# Altium schematic symbol library Electronic Devices_LIB.SchLib: 703 symbols (part 2 of 8) (continued)
## DIO_SCTKY_30V_2A_SDM2U30CSP-7
designator D?, comment SDM2U30CSP-7
Rectifier Diode Schottky 30V 2A 2-Pin X3-WLP T/R; Manufacturer: Diodes; Capacitance: 1.1E-10F; Reverse Voltage (DC): 20V; Forward Voltage: 480mV; Max Forward Surge Current (Ifsm): 20A; Max Reverse Current: 150uA; Supplier 1: Digi-Key; Manufacturer Part Number: SDM2U30CSP-7; RoHS: Yes; Category: Rectifier Diodes; Stock 1: 100855; Pricing 1: 1=0.35, 10=0.285, 100=0.1939, 500=0.14544, 1000=0.10908, 2000=0.09999 (USD); Mount: Surface Mount; Number of Pins: 2; Min Operating Temperature: -55°C; Max Operating Temperature: 150°C; Packaging: Tape and Reel; Average Rectified Current: 2A; Forward Current: 2A; Max Repetitive Reverse Voltage (Vrrm): 20V; Package Quantity: 5000; Max Reverse Voltage (DC): 30V; Series: -; RoHS Compliant: Yes; ComponentLink1URL: http://www.mouser.com/ds/2/115/SDM2U30CSP-520285.pdf?src-supplier=Mouser; ComponentLink1Description: http://www.mouser.com/ds/2/115/SDM2U30CSP-520285.pdf?src-supplier=Mouser; ComponentLink2URL: https://www.diodes.com/assets/Datasheets/SDM2U30CSP.pdf?src-supplier=Digi-Key; ComponentLink2Description: https://www.diodes.com/assets/Datasheets/SDM2U30CSP.pdf?src-supplier=Digi-Key; Supplier Part Number 1: SDM2U30CSP-7DICT-ND
footprint DIO_SCKY_X3-WLB1608-2 (X3-WLB1608-2)
pins: 1 K, 2 A

## DIO_SCTKY_40V_2A
designator D?, comment SS24-E3/5BT
SS24 Series 40 V 2 A Surface Mount Schottky Barrier Rectifier - DO-214AA; Manufacturer: Vishay Semiconductors; Max Surge Current: 75A; Max Reverse Current: 400uA; Average Rectified Current: 2A; Element Configuration: Single; Max Reverse Voltage (DC): 40V; Forward Voltage: 500mV; Manufacturer Part Number: SS24-E3/5BT; RoHS: Yes; Category: Rectifier Diodes; Stock 1: 27700; Pricing 1: 1=0.46000, 10=0.39700, 100=0.29620, 500=0.23274, 1000=0.17984 (USD); Mount: Surface Mount; Case/Package: SMB; Number of Pins: 2; Contact Plating: Tin,Matte; Min Operating Temperature: -65°C; Max Operating Temperature: 125°C; Package Quantity: 3200; Packaging: Tape and Reel; Max Reverse Leakage Current: 400uA; Peak Non-Repetitive Surge Current: 75A; Max Forward Surge Current (Ifsm): 75A; Series: -; Length: 4.7mm; Width: 3.8mm; Radiation Hardening: No; Lead Free: Lead Free; RoHS Compliant: Yes; ComponentLink1URL: http://www.mouser.com/ds/2/427/ss22-59686.pdf?src-supplier=Mouser; ComponentLink1Description: http://www.mouser.com/ds/2/427/ss22-59686.pdf?src-supplier=Mouser; ComponentLink2URL: http://components.arrow.com/part/dataview/42820088S9351294N5680?src-supplier=Arrow+Electronics; ComponentLink2Description: http://components.arrow.com/part/dataview/42820088S9351294N5680?src-supplier=Arrow+Electronics; ComponentLink3URL: http://www.vishay.com/docs/89278/ss22.pdf?src-supplier=Digi-Key; ComponentLink3Description: http://www.vishay.com/docs/89278/ss22.pdf?src-supplier=Digi-Key; ComponentLink4URL: http://www.vishay.com/docs/88748/88748.pdf?src-supplier=Avnet; ComponentLink4Description: http://www.vishay.com/docs/88748/88748.pdf?src-supplier=Avnet; ComponentLink5URL: http://www.vishay.com/docs/88748/88748.pdf?src-supplier=Future+Electronics; ComponentLink5Description: http://www.vishay.com/docs/88748/88748.pdf?src-supplier=Future+Electronics; Supplier 1: Digi-Key; Supplier 2: Mouser; Supplier 3: Arrow Electronics; Supplier Part Number 1: SS24-E3/5BTGICT-ND; Supplier Part Number 2: 625-SS24-E3/5BT; Supplier Part Number 3: SS24-E3/5BT; Forward Current: 2A; Max Repetitive Reverse Voltage (Vrrm): 40V
footprint DIO_DIOM4336X24N (MoldeDiode, 2-Leads, Body 4.31x3.62mm, IPC Medium Density)
pins: 1 K, 2 A

## DIO_SCTKY_40V_3A
designator D?, comment SS34-E3/9AT
Rectifier Diode, schottky, 40V V(Rrm), do-214Ab / Smc; Manufacturer: Vishay Semiconductors; Max Surge Current: 100A; Element Configuration: Single; Max Reverse Leakage Current: 500uA; Average Rectified Current: 3A; Forward Voltage: 500mV; Supplier 1: TTI; Manufacturer Part Number: SS34-E3/9AT; RoHS: Yes; Category: Rectifier Diodes; Stock 1: 7000; Pricing 1: 3500=0.18200 (USD); Mount: Surface Mount; Case/Package: SMC; Number of Pins: 2; Min Operating Temperature: -55°C; Max Operating Temperature: 125°C; Package Quantity: 3500; Packaging: Tape and Reel; Peak Non-Repetitive Surge Current: 100A; Max Reverse Voltage (DC): 40V; Series: -; Radiation Hardening: No; RoHS Compliant: Yes; ComponentLink1URL: https://datasheet.ciiva.com/920/ss32-920172.pdf?src-supplier=Digi-Key; ComponentLink1Description: https://datasheet.ciiva.com/920/ss32-920172.pdf?src-supplier=Digi-Key; Supplier Part Number 1: SS34-E3/9AT; Max Reverse Current: 500uA; Max Repetitive Reverse Voltage (Vrrm): 40V; Forward Current: 3A
footprint DIO_Vishay_SMC_MFG (DO-214AB (SMA))
pins: 1 K, 2 A

## DIO_SCTKY_40V_300mA_CD0603-B0340R
designator D?, comment CD0603-B0340R
Rectifier Diode Small Signal Schottky 40V 0.3A Automotive 2-Pin Case 0603(1608Metric) T/R; Manufacturer: Bourns; Average Rectified Current: 300mA; Max Forward Surge Current (Ifsm): 2A; Max Reverse Current: 3uA; Capacitance: 35pF; Supplier 1: Digikey; Manufacturer Part Number: CD0603-B0340R; RoHS: Yes; Category: Rectifier Diodes; Stock 1: 208205; Pricing 1: 1=0.38, 10=0.266, 100=0.1343, 500=0.10958, 1000=0.0813 (USD); Mount: Surface Mount; Case/Package: 0603; Case Code (Imperial): 0603; Case Code (Metric): 1608; Min Operating Temperature: -40°C; Max Operating Temperature: 125°C; Packaging: Cut Tape; Max Reverse Voltage (DC): 40V; Series: -; Forward Current: 300mA; Max Repetitive Reverse Voltage (Vrrm): 40V; Reverse Voltage: 40V; Height: 800um; RoHS Compliant: Yes; ComponentLink1URL: http://www.farnell.com/datasheets/2372434.pdf?src-supplier=Farnell; ComponentLink1Description: http://www.farnell.com/datasheets/2372434.pdf?src-supplier=Farnell; ComponentLink2URL: https://www.bourns.com/docs/product-datasheets/cd0603-b.pdf?src-supplier=Digikey; ComponentLink2Description: https://www.bourns.com/docs/product-datasheets/cd0603-b.pdf?src-supplier=Digikey; ComponentLink3URL: http://www.farnell.com/datasheets/2372434.pdf?src-supplier=Newark; ComponentLink3Description: http://www.farnell.com/datasheets/2372434.pdf?src-supplier=Newark; Supplier Part Number 1: CD0603-B0340RDKR-ND
footprint DIO_CD0603-B0340R_BRN
pins: 1 K, 2 A

## DIO_SCTKY_40V_520mA_ZLLS400TA
designator D?, comment ZLLS400TA
DIODE SCHOTTKY 40V 520MA SOD323; Manufacturer: Diodes Zetex; Peak Non-Repetitive Surge Current: 12A; Max Reverse Current: 10uA; Forward Voltage: 800mV; Reverse Recovery Time: 3ns; Max Forward Surge Current (Ifsm): 2.5A; Power Dissipation: 330mW; Polarity: Standard; Capacitance: 15pF; Supplier 1: Digi-Key; Manufacturer Part Number: ZLLS400TA; RoHS: Yes; Category: Rectifier Diodes; Stock 1: 46017; Pricing 1: 1=0.42, 10=0.359, 100=0.2495, 500=0.19478, 1000=0.15832 (USD); Mount: Surface Mount; Number of Pins: 2; Weight: 0.000173oz; Min Operating Temperature: -55°C; Max Operating Temperature: 150°C; Forward Current: 520mA; Max Repetitive Reverse Voltage (Vrrm): 40V; Package Quantity: 3000; Packaging: Tape and Reel; Average Rectified Current: 520mA; Termination: SMD/SMT; Voltage Rating (DC): 40V; Current Rating: 520mA; Output Current: 520mA; Max Reverse Voltage (DC): 40V; Series: -; Length: 1.8mm; Width: 1.4mm; Height: 0.8mm; Radiation Hardening: No; Lead Free: Lead Free; RoHS Compliant: Yes; ComponentLink1URL: https://datasheet.ciiva.com/914/zlls400-914210.pdf?src-supplier=Digi-Key; ComponentLink1Description: https://datasheet.ciiva.com/914/zlls400-914210.pdf?src-supplier=Digi-Key; ComponentLink2URL: https://datasheet.ciiva.com/914/zlls400-914210.pdf?src-supplier=Avnet; ComponentLink2Description: https://datasheet.ciiva.com/914/zlls400-914210.pdf?src-supplier=Avnet; ComponentLink3URL: https://datasheet.ciiva.com/4715/zlls400-4715517.pdf?src-supplier=Mouser; ComponentLink3Description: https://datasheet.ciiva.com/4715/zlls400-4715517.pdf?src-supplier=Mouser; ComponentLink4URL: https://datasheet.ciiva.com/16379/zlls400-16379288.pdf?src-supplier=Future+Electronics; ComponentLink4Description: https://datasheet.ciiva.com/16379/zlls400-16379288.pdf?src-supplier=Future+Electronics; ComponentLink5URL: https://datasheet.ciiva.com/914/zlls400-914211.pdf?src-supplier=Digi-Key; ComponentLink5Description: https://datasheet.ciiva.com/914/zlls400-914211.pdf?src-supplier=Digi-Key; ComponentLink6URL: https://datasheet.ciiva.com/914/zlls400-914212.pdf?src-supplier=Digi-Key; ComponentLink6Description: https://datasheet.ciiva.com/914/zlls400-914212.pdf?src-supplier=Digi-Key; Supplier Part Number 1: ZLLS400TACT-ND
footprint DIO_SOD2512X113N (SOD-323)
pins: 1 K, 2 A

## DIO_SCTKY_100V_6A_PMEG100V060ELPDZ
designator D?, comment PMEG100V060ELPDZ
DIODESCHOTTKY100V6ACFP15; Manufacturer: Nexperia; Supplier 1: Digikey; Manufacturer Part Number: PMEG100V060ELPDZ; RoHS: Yes; Category: Schottky Diodes; Stock 1: 60422; Pricing 1: 1=0.58, 10=0.504, 100=0.3491, 500=0.29166 (USD); RoHS Compliant: Yes; ComponentLink1URL: http://www.farnell.com/datasheets/2341403.pdf?src-supplier=Farnell; ComponentLink1Description: http://www.farnell.com/datasheets/2341403.pdf?src-supplier=Farnell; ComponentLink2URL: https://datasheet.octopart.com/PMEG100V060ELPDZ-Nexperia-datasheet-87796136.pdf?src-supplier=Future+Electronics; ComponentLink2Description: https://datasheet.octopart.com/PMEG100V060ELPDZ-Nexperia-datasheet-87796136.pdf?src-supplier=Future+Electronics
footprint DIO_SCKTY_PMEG060V100EPDAZ (SOT1289)
pins: A, K

## DIO_SCTKY_200V_1A_DFLS1200Q-7
designator D?, comment DFLS1200Q-7
Rectifier Diode Schottky 200V 1A Automotive 2-Pin PowerDI 123 T/R; Manufacturer: Diodes; Forward Voltage: 850mV; Max Forward Surge Current (Ifsm): 40A; Max Reverse Current: 100uA; Supplier 1: Mouser; Manufacturer Part Number: DFLS1200Q-7; RoHS: Yes; Category: Rectifier Diodes; Stock 1: 5123; Pricing 1: 1=0.65, 10=0.556, 50=0.556, 100=0.398, 500=0.333, 1000=0.27, 3000=0.251, 6000=0.25, 10000=0.25 (USD); Mount: Surface Mount; Number of Pins: 123; Min Operating Temperature: -55°C; Max Operating Temperature: 150°C; Packaging: Tape and Reel; Average Rectified Current: 1A; Forward Current: 1A; Max Repetitive Reverse Voltage (Vrrm): 200V; Package Quantity: 3000; Max Reverse Voltage (DC): 200V; Series: Automotive, AEC-Q101; RoHS Compliant: Yes; ComponentLink1URL: http://www.mouser.com/ds/2/115/DFLS1200Q-335808.pdf?src-supplier=Mouser; ComponentLink1Description: http://www.mouser.com/ds/2/115/DFLS1200Q-335808.pdf?src-supplier=Mouser; ComponentLink2URL: http://www.farnell.com/datasheets/2814371.pdf?src-supplier=Farnell; ComponentLink2Description: http://www.farnell.com/datasheets/2814371.pdf?src-supplier=Farnell; ComponentLink3URL: https://www.diodes.com/assets/Datasheets/DFLS1200Q.pdf?src-supplier=Digi-Key; ComponentLink3Description: https://www.diodes.com/assets/Datasheets/DFLS1200Q.pdf?src-supplier=Digi-Key; ComponentLink4URL: http://www.farnell.com/datasheets/2814371.pdf?src-supplier=Element14; ComponentLink4Description: http://www.farnell.com/datasheets/2814371.pdf?src-supplier=Element14; ComponentLink5URL: http://www.farnell.com/datasheets/2814371.pdf?src-supplier=Newark; ComponentLink5Description: http://www.farnell.com/datasheets/2814371.pdf?src-supplier=Newark; ComponentLink6URL: http://diodes.com/datasheets/DFLS1200Q.pdf?src-supplier=Avnet; ComponentLink6Description: http://diodes.com/datasheets/DFLS1200Q.pdf?src-supplier=Avnet; Supplier Part Number 1: 621-DFLS1200Q7
footprint DIO_SCKY_DFLS1200Q7 (POWERDI 123)
pins: 1 K, 2 A

## DIO_TVS_3.3V_ESD7C3.3DT5G
designator D?, comment ESD7C3.3DT5G
Transient Voltage Suppressor and ESD Protection Diode, SOT-723, 3.3 V; Manufacturer: ON Semiconductor; Direction: Unidirectional; Reverse Standoff Voltage: 3.3V; Capacitance: 13pF; Number of Channels: 2; Breakdown Voltage: 5V; Power Line Protection: No; Leakage Current: 1uA; Test Current: 1mA; Peak Pulse Power: 240mW; ESD Protection: Yes; Diode Type: ZENER; Clamping Voltage-Max: 10V; Supplier 1: Digi-Key; Manufacturer Part Number: ESD7C3.3DT5G; RoHS: Yes; Category: ESD and Circuit Protection ICs; Stock 1: 43169; Pricing 1: 1=0.43, 10=0.303, 100=0.1529, 500=0.1355, 1000=0.10544, 2000=0.09437 (USD); Case/Package: SOT-723-3; Number of Pins: 3; Min Operating Temperature: -55°C; Max Operating Temperature: 150°C; Package Quantity: 1; Packaging: Tape and Reel; Series: Automotive, AEC-Q101; Operating Supply Voltage: 3.3V; Polarity: Unidirectional; Termination: SMD/SMT; Number of Unidirectional Channels: 2; Min Breakdown Voltage: 5V; Working Voltage: 3.3V; Max Breakdown Voltage: 5V; Number of Lines: 2; Max Reverse Leakage Current: 1uA; Max Power Dissipation: 240mW; Length: 1.2mm; Width: 0.85mm; Height: 0.55mm; Depth: 0.8mm; Radiation Hardening: No; RoHS Compliant: Yes; Reach SVHC Compliant: No; Lead Free: Lead Free; Halogen Free: Halogen Free; ComponentLink1URL: https://datasheet.ciiva.com/1219/1748973-1219271.pdf?src-supplier=Newark; ComponentLink1Description: https://datasheet.ciiva.com/1219/1748973-1219271.pdf?src-supplier=Newark; ComponentLink2URL: https://datasheet.ciiva.com/339/esd7c3-3d-d-339817.pdf?src-supplier=Digi-Key; ComponentLink2Description: https://datasheet.ciiva.com/339/esd7c3-3d-d-339817.pdf?src-supplier=Digi-Key; ComponentLink3URL: https://datasheet.ciiva.com/11195/esd7c3-3d-d-11195335.pdf?src-supplier=Avnet; ComponentLink3Description: https://datasheet.ciiva.com/11195/esd7c3-3d-d-11195335.pdf?src-supplier=Avnet; ComponentLink4URL: https://datasheet.ciiva.com/1268/esd7c3-3d-d-1268407.pdf?src-supplier=Element14; ComponentLink4Description: https://datasheet.ciiva.com/1268/esd7c3-3d-d-1268407.pdf?src-supplier=Element14; ComponentLink5URL: https://datasheet.ciiva.com/339/esd7c3-3d-d-339819.pdf?src-supplier=Digi-Key; ComponentLink5Description: https://datasheet.ciiva.com/339/esd7c3-3d-d-339819.pdf?src-supplier=Digi-Key; ComponentLink6URL: https://datasheet.ciiva.com/16348/esd7c3-3d-d-16348886.pdf?src-supplier=Future+Electronics; ComponentLink6Description: https://datasheet.ciiva.com/16348/esd7c3-3d-d-16348886.pdf?src-supplier=Future+Electronics; Supplier Part Number 1: ESD7C3.3DT5GOSCT-ND
footprint DIO_TVS_SOTFL40P120X55-3N (SOT-723)
pins: 1 CATHODE1, 2 CATHODE2, 3 ANODE

## DIO_TVS_4CH_4V_IP4292CZ10-TBR,115
designator D?, comment IP4292CZ10-TBR,115
IP4292CZ10 Series 4 Channel 4 V 0.55 pF ESD Protected TVS Diode - DFN2510A-10; Manufacturer: Nexperia; Supplier 1: Digikey; Manufacturer Part Number: IP4292CZ10-TBR,115; RoHS: Yes; Category: ESD and Circuit Protection ICs; Stock 1: 24808; Pricing 1: 1=0.51, 10=0.398, 100=0.2386, 500=0.22096, 1000=0.15025, 2000=0.13833 (USD); RoHS Compliant: Yes; ComponentLink1URL: https://assets.nexperia.com/documents/data-sheet/IP4292CZ10-TBR.pdf?src-supplier=Digikey; ComponentLink1Description: https://assets.nexperia.com/documents/data-sheet/IP4292CZ10-TBR.pdf?src-supplier=Digikey; Supplier Part Number 1: 1727-1219-1-ND
footprint DIO_TVS_SON50P100X250X50-10N (10-XFDFN)
pins: 1 CH1, 2 CH2, 3 GND1 (power), 4 CH3, 5 CH4, 6 NC1, 7 NC2, 8 GND2 (power), 9 NC3, 10 NC4

## DIO_TVS_5.5V_PRTR5V0U2F,115
designator D?, comment PRTR5V0U2F,115
TVS DIODE 5.5VWM SOT886; Manufacturer: Nexperia; Supplier 1: Digikey; Manufacturer Part Number: PRTR5V0U2F,115; RoHS: Yes; Category: ESD and Circuit Protection ICs; Stock 1: 243532; Pricing 1: 1=0.41, 10=0.348, 100=0.2416, 500=0.18862, 1000=0.15332, 2000=0.13706 (USD); RoHS Compliant: Yes; ComponentLink1URL: http://www.farnell.com/datasheets/1712879.pdf?src-supplier=Farnell; ComponentLink1Description: http://www.farnell.com/datasheets/1712879.pdf?src-supplier=Farnell; ComponentLink2URL: https://datasheet.octopart.com/PRTR5V0U2F%2C115-Nexperia-datasheet-8330238.pdf?src-supplier=Newark; ComponentLink2Description: https://datasheet.octopart.com/PRTR5V0U2F%2C115-Nexperia-datasheet-8330238.pdf?src-supplier=Newark; ComponentLink3URL: https://assets.nexperia.com/documents/data-sheet/PRTR5V0U2F_PRTR5V0U2K.pdf?src-supplier=Digikey; ComponentLink3Description: https://assets.nexperia.com/documents/data-sheet/PRTR5V0U2F_PRTR5V0U2K.pdf?src-supplier=Digikey; ComponentLink4URL: https://datasheet.octopart.com/PRTR5V0U2F%2C115-Nexperia-datasheet-137756209.pdf?src-supplier=LKR; ComponentLink4Description: https://datasheet.octopart.com/PRTR5V0U2F%2C115-Nexperia-datasheet-137756209.pdf?src-supplier=LKR; Supplier Part Number 1: 1727-4161-1-ND
footprint DIO_TVS_Nexperia_SOT886_MFG (6-XFDFN)
pins: 1 I/O1, 2 GND (power), 3 I/O2, 4 I/O2, 5 VCC (power), 6 I/O1

## DIO_TVS_5V_ESD5Z5.0T1G
designator D?, comment ESD5Z5.0T1G
ESD5Z Series 6.2 V 80 pF 5 Vrwm TVS and ESD Protection Diodes - SOD-523; Manufacturer: ON Semiconductor; Direction: Unidirectional; Operating Supply Voltage: 5V; Min Breakdown Voltage: 6.2V; Peak Pulse Power: 174W; Peak Pulse Current: 9.4A; Test Current: 1mA; Max Reverse Leakage Current: 50nA; Number of Elements: 1; Capacitance: 80pF; Clamping Voltage: 18.6V; Power Line Protection: No; ESD Protection: Yes; Max Power Dissipation: 240W; Diode Type: ZENER; Clamping Voltage-Max: 11.6V; Supplier 1: Digikey; Manufacturer Part Number: ESD5Z5.0T1G; RoHS: Yes; Category: ESD and Circuit Protection ICs; Stock 1: 292695; Pricing 1: 1=0.24, 10=0.162, 100=0.0791, 500=0.06598, 1000=0.04584, 3000=0.03973, 6000=0.03686, 9000=0.03056, 30000=0.03002, 75000=0.02697, 150000=0.02337 (USD); Case/Package: SOD-523-2; Number of Pins: 2; Min Operating Temperature: -55°C; Max Operating Temperature: 150°C; Packaging: Tape and Reel; Reverse Standoff Voltage: 5V; Breakdown Voltage: 6.2V; Working Voltage: 5V; Package Quantity: 1; Max Surge Current: 9.4A; Number of Channels: 1; Reverse Breakdown Voltage: 6.2V; Number of Unidirectional Channels: 1; Polarity: Unidirectional; Termination: SMD/SMT; Max Breakdown Voltage: 6.2V; Leakage Current: 50nA; Number of Lines: 1; Series: Automotive, AEC-Q101; Length: 1.2mm; Width: 0.9mm; Height: 0.7mm; Depth: 0.8mm; Radiation Hardening: No; Lead Free: Lead Free; Halogen Free: Halogen Free; RoHS Compliant: Yes; Reach SVHC Compliant: No; ComponentLink1URL: https://datasheet.ciiva.com/15143/getdatasheetpartid-147990-15143766.pdf?src-supplier=Verical; ComponentLink1Description: https://datasheet.ciiva.com/15143/getdatasheetpartid-147990-15143766.pdf?src-supplier=Verical; ComponentLink2URL: https://datasheet.ciiva.com/30479/0900766b8125092b-30479039.pdf?src-supplier=Rs; ComponentLink2Description: https://datasheet.ciiva.com/30479/0900766b8125092b-30479039.pdf?src-supplier=Rs; ComponentLink3URL: https://datasheet.ciiva.com/22637/esd5z2-5t1-d-22637184.pdf?src-supplier=Element14; ComponentLink3Description: https://datasheet.ciiva.com/22637/esd5z2-5t1-d-22637184.pdf?src-supplier=Element14; ComponentLink4URL: https://datasheet.ciiva.com/27748/1311839-27748800.pdf?src-supplier=Jameco; ComponentLink4Description: https://datasheet.ciiva.com/27748/1311839-27748800.pdf?src-supplier=Jameco; ComponentLink5URL: https://datasheet.ciiva.com/339/esd5z2-5t1-d-339748.pdf?src-supplier=Digikey; ComponentLink5Description: https://datasheet.ciiva.com/339/esd5z2-5t1-d-339748.pdf?src-supplier=Digikey; ComponentLink6URL: https://datasheet.ciiva.com/339/esd5z2-5t1-d-339749.pdf?src-supplier=Digikey; ComponentLink6Description: https://datasheet.ciiva.com/339/esd5z2-5t1-d-339749.pdf?src-supplier=Digikey; ComponentLink7URL: https://datasheet.ciiva.com/339/esd5z2-5t1-d-339750.pdf?src-supplier=Digikey; ComponentLink7Description: https://datasheet.ciiva.com/339/esd5z2-5t1-d-339750.pdf?src-supplier=Digikey; ComponentLink8URL: https://datasheet.ciiva.com/16385/esd5z2-5t1-d-16385093.pdf?src-supplier=Future+Electronics; ComponentLink8Description: https://datasheet.ciiva.com/16385/esd5z2-5t1-d-16385093.pdf?src-supplier=Future+Electronics; ComponentLink9URL: https://datasheet.ciiva.com/8084/esd5z2-5t1-d-8084057.pdf?src-supplier=Avnet; ComponentLink9Description: https://datasheet.ciiva.com/8084/esd5z2-5t1-d-8084057.pdf?src-supplier=Avnet; ComponentLink10URL: https://datasheet.ciiva.com/22637/1878252-22637182.pdf?src-supplier=Element14; ComponentLink10Description: https://datasheet.ciiva.com/22637/1878252-22637182.pdf?src-supplier=Element14; Supplier Part Number 1: ESD5Z5.0T1GOSCT-ND
footprint SOD523_SODFL1608X70N
pins: 1 K, 2 A

## DIO_TVS_BID_5V_PESD5V0S1BB,115
designator D?, comment PESD5V0S1BB,115
ESD Suppressor Diode TVS Bi-Dir 5V Automotive 2-Pin SOD-523 T/R / TVS DIODE 5VWM 14VC SOD523; Manufacturer: Nexperia; Breakdown Voltage: 5.5V; Supplier 1: Digikey; Manufacturer Part Number: PESD5V0S1BB,115; RoHS: Yes; Category: ESD and Circuit Protection ICs; Stock 1: 221713; Pricing 1: 1=0.35, 10=0.243, 100=0.1226, 500=0.10004, 1000=0.07422, 3000=0.06245, 6000=0.0597, 9000=0.05163, 30000=0.05067, 75000=0.04195, 150000=0.04131 (USD); Number of Pins: 2; Packaging: Tape and Reel; Operating Supply Voltage: 5V; RoHS Compliant: Yes; ComponentLink1URL: http://www.farnell.com/datasheets/461331.pdf?src-supplier=Farnell; ComponentLink1Description: http://www.farnell.com/datasheets/461331.pdf?src-supplier=Farnell; ComponentLink2URL: https://www.mouser.com/ds/2/302/PESD5V0S1BA_BB_BL-1150699.pdf?src-supplier=Mouser; ComponentLink2Description: https://www.mouser.com/ds/2/302/PESD5V0S1BA_BB_BL-1150699.pdf?src-supplier=Mouser; ComponentLink3URL: https://assets.nexperia.com/documents/data-sheet/PESD5V0S1BA_BB_BL.pdf?src-supplier=Digikey; ComponentLink3Description: https://assets.nexperia.com/documents/data-sheet/PESD5V0S1BA_BB_BL.pdf?src-supplier=Digikey; ComponentLink4URL: http://www.farnell.com/datasheets/461331.pdf?src-supplier=Newark; ComponentLink4Description: http://www.farnell.com/datasheets/461331.pdf?src-supplier=Newark; Supplier Part Number 1: 1727-3838-1-ND
footprint DIO_TVS_SODFL1608X65N
pins: 1 K1, 2 K2

## DIO_TVS_BID_USBLC6-2SC6
designator D?, comment USBLC6-2SC6
USBLC6 Series 2 Line 6 V Uni / Bi-Directional ESD Protection - SOT-23-6; Manufacturer: STMicroelectronics; Capacitance: 3.5pF; Leakage Current: 150nA; Direction: Unidirectional,Bidirectional; Operating Supply Voltage: 1.1V; Number of Channels: 2; Breakdown Voltage: 6V; Clamping Voltage: 17V; Reverse Standoff Voltage: 5.25V; Power Line Protection: Yes; Test Current: 1mA; Peak Pulse Current: 5A; Data Rate: 480Mbps; Number of Elements: 1; Working Voltage: 5V; Supplier 1: Digi-Key; Manufacturer Part Number: USBLC6-2SC6; RoHS: Yes; Category: TVS Diodes; Stock 1: 77032; Pricing 1: 1=0.61, 10=0.522, 100=0.3897, 500=0.3062, 1000=0.2366 (USD); Mount: Surface Mount; Case/Package: SOT-23; Number of Pins: 6; Min Operating Temperature: -40°C; Max Operating Temperature: 125°C; Packaging: Tape and Reel; Termination: SMD/SMT; Series: USB; Package Quantity: 3000; Polarity: Unidirectional,Bidirectional; Number of Bidirectional Channels: 2; Min Breakdown Voltage: 6V; ESD Protection: Yes; Max Reverse Leakage Current: 150nA; Reverse Breakdown Voltage: 6V; Max Breakdown Voltage: 6V; Clamping Voltage-Max: 17V; Length: 3.05mm; Width: 1.75mm; Height: 1.3mm; Depth: 1.75mm; Radiation Hardening: No; Reach SVHC Compliant: No; Lead Free: Lead Free; RoHS Compliant: Yes; ComponentLink1URL: https://datasheet.ciiva.com/1268/1690354-1268384.pdf?src-supplier=Element14; ComponentLink1Description: https://datasheet.ciiva.com/1268/1690354-1268384.pdf?src-supplier=Element14; ComponentLink2URL: https://datasheet.ciiva.com/4508/cd00050750-113117-4508433.pdf?src-supplier=Mouser; ComponentLink2Description: https://datasheet.ciiva.com/4508/cd00050750-113117-4508433.pdf?src-supplier=Mouser; ComponentLink3URL: https://datasheet.ciiva.com/15143/getdatasheetpartid-148465-15143789.pdf?src-supplier=Verical; ComponentLink3Description: https://datasheet.ciiva.com/15143/getdatasheetpartid-148465-15143789.pdf?src-supplier=Verical; ComponentLink4URL: https://datasheet.ciiva.com/16200/cd00050750-16200026.pdf?src-supplier=Future+Electronics; ComponentLink4Description: https://datasheet.ciiva.com/16200/cd00050750-16200026.pdf?src-supplier=Future+Electronics; ComponentLink5URL: https://datasheet.ciiva.com/41444/001184109-da-01-en-ic-esd-protecti-usblc6-2sc6-sot-23-6-stm-41444156.pdf?src-supplier=Conrad; ComponentLink5Description: https://datasheet.ciiva.com/41444/001184109-da-01-en-ic-esd-protecti-usblc6-2sc6-sot-23-6-stm-41444156.pdf?src-supplier=Conrad; Supplier Part Number 1: 497-5235-6-ND
footprint DIO_TVS_SOT95P280X145-6N (SOT-23-6)
pins: 1 I/O1, 2 GND, 3 I/O2, 4 I/O2, 5 VBUS, 6 I/O1

## DIO_TVS_USB_PRTR5V0U2X,215
designator D?, comment PRTR5V0U2X,215
PRTR5V0U2X - Ultra low capacitance double rail-to-rail ESD protection diode; Manufacturer: Nexperia; Supplier 1: Mouser; Manufacturer Part Number: PRTR5V0U2X,215; RoHS: Yes; Category: ESD and Circuit Protection ICs; Stock 1: 109301; Pricing 1: 1=0.45, 10=0.368, 50=0.367, 100=0.262, 500=0.21, 1000=0.171, 3000=0.135, 9000=0.129, 10000=0.129, 24000=0.127, 45000=0.125 (USD); RoHS Compliant: Yes; ComponentLink1URL: http://www.farnell.com/datasheets/109718.pdf?src-supplier=Farnell; ComponentLink1Description: http://www.farnell.com/datasheets/109718.pdf?src-supplier=Farnell; ComponentLink2URL: https://assets.nexperia.com/documents/data-sheet/PRTR5V0U2X.pdf?src-supplier=Digikey; ComponentLink2Description: https://assets.nexperia.com/documents/data-sheet/PRTR5V0U2X.pdf?src-supplier=Digikey; ComponentLink3URL: http://www.farnell.com/datasheets/109718.pdf?src-supplier=Newark; ComponentLink3Description: http://www.farnell.com/datasheets/109718.pdf?src-supplier=Newark; ComponentLink4URL: https://datasheet.octopart.com/PRTR5V0U2X%2C215-Nexperia-datasheet-5405949.pdf?src-supplier=Element14; ComponentLink4Description: https://datasheet.octopart.com/PRTR5V0U2X%2C215-Nexperia-datasheet-5405949.pdf?src-supplier=Element14; Supplier Part Number 1: 771-PRTR5V0U2X-T/R
footprint DIO_TVS_Nexperia_SOT143B_MFG (SOT143B)
pins: 1 GND (power), 2 I/O 1 (io), 3 I/O 2 (io), 4 VCC (power)

## DIO_ZENER_3.3V_300mW_BZX585-B3V3,115
designator D?, comment BZX585-B3V3,115
DIODE ZENER 3.3V 300MW SOD523; Manufacturer: Nexperia; Supplier 1: Mouser; Manufacturer Part Number: BZX585-B3V3,115; RoHS: Yes; Category: Zener Diodes; Stock 1: 47007; Pricing 1: 1=0.38, 10=0.258, 50=0.258, 100=0.105, 1000=0.073, 3000=0.054, 9000=0.048, 10000=0.048, 24000=0.044, 45000=0.042, 99000=0.037 (USD); RoHS Compliant: Yes; ComponentLink1URL: http://www.farnell.com/datasheets/2174102.pdf?src-supplier=Farnell; ComponentLink1Description: http://www.farnell.com/datasheets/2174102.pdf?src-supplier=Farnell; ComponentLink2URL: https://assets.nexperia.com/documents/data-sheet/BZX585_SERIES.pdf?src-supplier=Digikey; ComponentLink2Description: https://assets.nexperia.com/documents/data-sheet/BZX585_SERIES.pdf?src-supplier=Digikey; ComponentLink3URL: https://datasheet.octopart.com/BZX585-B3V3%2C115-Nexperia-datasheet-81456219.pdf?src-supplier=Future+Electronics; ComponentLink3Description: https://datasheet.octopart.com/BZX585-B3V3%2C115-Nexperia-datasheet-81456219.pdf?src-supplier=Future+Electronics; Supplier Part Number 1: 771-BZX585-B3V3115
footprint DIO_ZENER_BZX585B3V3115 (SC-79, SOD-523)
pins: 1 K, 2 A

## DIO_ZENER_6.4V_SMAJ5.0A-E3/5A
designator D?, comment SMAJ5.0A-E3/5A
SMAJ5.0A Series 6.4 V 43.5 A 400 W Transient Voltage Suppressor - SMA (DO-214AC); Manufacturer: Vishay Semiconductors; Operating Supply Voltage: 5V; Max Surge Current: 43.5A; Direction: Unidirectional; Reverse Breakdown Voltage: 6.4V; Number of Elements: 1; Clamping Voltage: 9.2V; Peak Pulse Power: 400W; Max Breakdown Voltage: 7.07V; Test Current: 10mA; Max Reverse Leakage Current: 800uA; Max Forward Surge Current (Ifsm): 40A; Power Line Protection: No; Diode Type: ZENER; Supplier 1: Digikey; Manufacturer Part Number: SMAJ5.0A-E3/5A; RoHS: Yes; Category: TVS Diodes; Stock 1: 12869; Pricing 1: 1=0.43, 10=0.302, 100=0.1523, 500=0.13498, 1000=0.10504, 2000=0.09401 (USD); Case/Package: SMA; Number of Pins: 2; Min Operating Temperature: -55°C; Max Operating Temperature: 150°C; Package Quantity: 7500; Packaging: Tape and Reel; Breakdown Voltage: 6.4V; Number of Channels: 1; Polarity: Unidirectional; Reverse Standoff Voltage: 5V; Min Breakdown Voltage: 6.4V; Peak Pulse Current: 43.5A; Max Power Dissipation: 400W; Leakage Current: 800uA; Series: TransZorb®; Number of Unidirectional Channels: 1; Length: 4.5mm; Width: 2.79mm; Height: 2.09mm; Reach SVHC Compliant: Unknown; ComponentLink1URL: https://datasheet.ciiva.com/29588/smaj50a-29588012.pdf?src-supplier=Digikey; ComponentLink1Description: https://datasheet.ciiva.com/29588/smaj50a-29588012.pdf?src-supplier=Digikey; ComponentLink2URL: https://datasheet.ciiva.com/29588/smaj50a-29588013.pdf?src-supplier=Digikey; ComponentLink2Description: https://datasheet.ciiva.com/29588/smaj50a-29588013.pdf?src-supplier=Digikey; ComponentLink3URL: https://datasheet.ciiva.com/29588/smaj50a-29588014.pdf?src-supplier=Digikey; ComponentLink3Description: https://datasheet.ciiva.com/29588/smaj50a-29588014.pdf?src-supplier=Digikey; ComponentLink4URL: https://datasheet.ciiva.com/7659/548547-7659949.pdf?src-supplier=Element14; ComponentLink4Description: https://datasheet.ciiva.com/7659/548547-7659949.pdf?src-supplier=Element14; ComponentLink5URL: https://datasheet.ciiva.com/4510/smaj50a-241759-4510277.pdf?src-supplier=Mouser; ComponentLink5Description: https://datasheet.ciiva.com/4510/smaj50a-241759-4510277.pdf?src-supplier=Mouser; Supplier Part Number 1: SMAJ5.0A-E3/5AGIDKR-ND
footprint DIO_DIOM5127X229N (DO-214AC, SMA)
pins: 1 K, 2 A

## ESD_EMI_PCMF1USB3SZ
designator U?, comment PCMF1USB3SZ
PCMFxUSB3S - Common-mode EMI filter for differential channels with integrated ESD protection; Manufacturer: Nexperia; Supplier 1: Digikey; Manufacturer Part Number: PCMF1USB3SZ; RoHS: Yes; Category: Common Mode Chokes; Stock 1: 25964; Pricing 1: 1=0.5, 10=0.387, 100=0.2321, 500=0.21488, 1000=0.14612, 2000=0.13452 (USD); RoHS Compliant: Yes; ComponentLink1URL: http://www.farnell.com/datasheets/2043701.pdf?src-supplier=Farnell; ComponentLink1Description: http://www.farnell.com/datasheets/2043701.pdf?src-supplier=Farnell; ComponentLink2URL: https://assets.nexperia.com/documents/data-sheet/PCMFXUSB3S_SER.pdf?src-supplier=Digikey; ComponentLink2Description: https://assets.nexperia.com/documents/data-sheet/PCMFXUSB3S_SER.pdf?src-supplier=Digikey; ComponentLink3URL: http://www.farnell.com/datasheets/2043701.pdf?src-supplier=Newark; ComponentLink3Description: http://www.farnell.com/datasheets/2043701.pdf?src-supplier=Newark; ComponentLink4URL: http://www.farnell.com/datasheets/2043701.pdf?src-supplier=Element14; ComponentLink4Description: http://www.farnell.com/datasheets/2043701.pdf?src-supplier=Element14; ComponentLink5URL: https://datasheet.octopart.com/PCMF1USB3SZ-Nexperia-datasheet-137234894.pdf?src-supplier=TME; ComponentLink5Description: https://datasheet.octopart.com/PCMF1USB3SZ-Nexperia-datasheet-137234894.pdf?src-supplier=TME; Supplier Part Number 1: 1727-2508-1-ND
footprint ESD_PESD1USB3BCX
pins: A1 channel_1+_external, A2 channel_1-_external, B1 ground_channel_1, C1 channel_1+_internal, C2 channel_1-_internal

## ESD_EMI_PCMF2USB3SZ
designator U?, comment PCMF2USB3SZ
PCMFxUSB3S - Common-mode EMI filter for differential channels with integrated ESD protection; Manufacturer: Nexperia; Supplier 1: Digikey; Manufacturer Part Number: PCMF2USB3SZ; RoHS: Yes; Category: Common Mode Chokes; Stock 1: 45981; Pricing 1: 1=0.72, 10=0.62, 100=0.4295, 500=0.35888, 1000=0.30542, 2000=0.27202 (USD); RoHS Compliant: Yes; ComponentLink1URL: http://www.farnell.com/datasheets/2043701.pdf?src-supplier=Farnell; ComponentLink1Description: http://www.farnell.com/datasheets/2043701.pdf?src-supplier=Farnell; ComponentLink2URL: http://datasheet.octopart.com/PCMF2USB3SZ-Nexperia-datasheet-97399282.pdf?src-supplier=Rs; ComponentLink2Description: http://datasheet.octopart.com/PCMF2USB3SZ-Nexperia-datasheet-97399282.pdf?src-supplier=Rs; ComponentLink3URL: http://datasheet.octopart.com/PCMF2USB3SZ-Nexperia-datasheet-97399282.pdf?src-supplier=Mouser; ComponentLink3Description: http://datasheet.octopart.com/PCMF2USB3SZ-Nexperia-datasheet-97399282.pdf?src-supplier=Mouser; ComponentLink4URL: http://datasheet.octopart.com/PCMF2USB3SZ-Nexperia-datasheet-97399282.pdf?src-supplier=Avnet; ComponentLink4Description: http://datasheet.octopart.com/PCMF2USB3SZ-Nexperia-datasheet-97399282.pdf?src-supplier=Avnet; ComponentLink5URL: https://datasheet.octopart.com/PCMF2USB3SZ-Nexperia-datasheet-62320956.pdf?src-supplier=Newark; ComponentLink5Description: https://datasheet.octopart.com/PCMF2USB3SZ-Nexperia-datasheet-62320956.pdf?src-supplier=Newark; ComponentLink6URL: https://assets.nexperia.com/documents/data-sheet/PCMFXUSB3S_SER.pdf?src-supplier=Digikey; ComponentLink6Description: https://assets.nexperia.com/documents/data-sheet/PCMFXUSB3S_SER.pdf?src-supplier=Digikey; ComponentLink7URL: http://datasheet.octopart.com/PCMF2USB3SZ-Nexperia-datasheet-97399282.pdf?src-supplier=Digikey; ComponentLink7Description: http://datasheet.octopart.com/PCMF2USB3SZ-Nexperia-datasheet-97399282.pdf?src-supplier=Digikey; ComponentLink8URL: http://datasheet.octopart.com/PCMF2USB3SZ-Nexperia-datasheet-97399282.pdf?src-supplier=Future+Electronics; ComponentLink8Description: http://datasheet.octopart.com/PCMF2USB3SZ-Nexperia-datasheet-97399282.pdf?src-supplier=Future+Electronics; ComponentLink9URL: http://datasheet.octopart.com/PCMF2USB3SZ-Nexperia-datasheet-97399282.pdf?src-supplier=Verical; ComponentLink9Description: http://datasheet.octopart.com/PCMF2USB3SZ-Nexperia-datasheet-97399282.pdf?src-supplier=Verical; ComponentLink10URL: https://datasheet.octopart.com/PCMF2USB3SZ-Nexperia-datasheet-97399282.pdf?src-supplier=LKR; ComponentLink10Description: https://datasheet.octopart.com/PCMF2USB3SZ-Nexperia-datasheet-97399282.pdf?src-supplier=LKR; ComponentLink11URL: https://datasheet.octopart.com/PCMF2USB3SZ-Nexperia-datasheet-137234894.pdf?src-supplier=TME; ComponentLink11Description: https://datasheet.octopart.com/PCMF2USB3SZ-Nexperia-datasheet-137234894.pdf?src-supplier=TME; Supplier Part Number 1: 1727-2509-1-ND
footprint ESD_PCMF2USB3SZ
pins: A1 CH1_IN+, A2 CH1_IN-, A3 CH2_IN+, A4 CH2_IN-, B1 GND_CH1, B2 GND_CH2, C1 CH1_OUT+, C2 CH1_OUT-, C3 CH2_OUT+, C4 CH2_OUT-

## FILTER_COMMON_MODE_10mH_SU9HF-02100
designator F?, comment SU9HF-02100
Ind Common Mode Choke 10mH 0.2A 4 Ohm Bobbin Core 4-Pin Radial Tray; Manufacturer: KEMET; Number of Lines: 2; Max Current Rating: 200mA; Voltage Rating (AC): 250V; Supplier 1: Digikey; Manufacturer Part Number: SU9HF-02100; RoHS: Yes; Category: Common Mode Chokes; Stock 1: 842; Pricing 1: 1=0.83, 10=0.703, 25=0.6392, 40=0.60075, 100=0.4984, 300=0.46007, 500=0.45 (USD); Mount: Through Hole; Min Operating Temperature: -25°C; Max Operating Temperature: 120°C; Series: SU; RoHS Compliant: Yes; ComponentLink1URL: https://api.kemet.com/component-edge/download/datasheet/SU9HF-02100.pdf?src-supplier=Digikey; ComponentLink1Description: https://api.kemet.com/component-edge/download/datasheet/SU9HF-02100.pdf?src-supplier=Digikey; ComponentLink2URL: https://datasheet.octopart.com/SU9HF-02100-KEMET-datasheet-166228759.pdf?src-supplier=Element14; ComponentLink2Description: https://datasheet.octopart.com/SU9HF-02100-KEMET-datasheet-166228759.pdf?src-supplier=Element14; Supplier Part Number 1: 399-SU9HF-02100-ND
footprint FILTER_SU9HF02100
pins: 1, 2, 3, 4

## FUSEHOLDER_10A_500V_00318201
designator FH?, comment 00318201
Fuse Holder Open Design; 5 x 20mm; 500V; 10A; 1P; Solder THT 22.5mm; Manufacturer: Schurter; Body Material: Thermoplastic; Voltage Rating: 250V; Number of Poles: 1; Fuse Size: 5 x 20mm; Supplier 1: Digikey; Manufacturer Part Number: 00318201; RoHS: Yes; Category: Fuse Holders; Stock 1: 157144; Pricing 1: 1=0.91, 50=0.676, 100=0.608, 500=0.47 (USD); Color: Black; Material: Tin; Contact Plating: Tin; Contact Material: Copper Alloy,Tin; Min Operating Temperature: -40°C; Max Operating Temperature: 85°C; Packaging: Bulk; Current Rating: 10A; Voltage Rating (DC): 500V; Voltage Rating (AC): 500V; Termination: PC Pin; Fuse Current: 10A; Series: OGN; Length: 25mm; Depth: 10.8mm; Lead Free: Lead Free; Reach SVHC Compliant: No; ComponentLink1URL: https://datasheet.ciiva.com/16203/typ-ogn-16203626.pdf?src-supplier=Future+Electronics; ComponentLink1Description: https://datasheet.ciiva.com/16203/typ-ogn-16203626.pdf?src-supplier=Future+Electronics; ComponentLink2URL: https://datasheet.ciiva.com/15188/getdatasheetpartid-392104-15188042.pdf?src-supplier=Verical; ComponentLink2Description: https://datasheet.ciiva.com/15188/getdatasheetpartid-392104-15188042.pdf?src-supplier=Verical; ComponentLink3URL: https://datasheet.ciiva.com/1269/1842496-1269251.pdf?src-supplier=Element14; ComponentLink3Description: https://datasheet.ciiva.com/1269/1842496-1269251.pdf?src-supplier=Element14; Supplier Part Number 1: 486-1258-ND
footprint Schurter_0031.8201_MFG
pins: 1, 2

## IC_ADC_12BIT_ADS7924IRTER
designator U?, comment ADS7924IRTER
Quad Channel Single ADC SAR 100ksps 12-bit Serial 16-Pin WQFN EP T/R; Manufacturer: Texas Instruments; Operating Supply Voltage: 5V; Min Supply Voltage: 2.2V; Max Supply Voltage: 5.5V; Interface: I2C; Number of Bits: 12; Sampling Rate: 100000S/s; Resolution: 12b; Number of A/D Converters: 1; Number of Analog Inputs: 4; Polarity: Unipolar; Supply Type: Analog,Digital; Integral Nonlinearity (INL): 1.5LSB; Min Supply Voltage (DC): 1.65V; Nominal Supply Current: 5uA; Supplier 1: Digikey; Manufacturer Part Number: ADS7924IRTER; RoHS: Yes; Category: Analog to Digital Converters (ADCs); Stock 1: 7027; Pricing 1: 1=2.87, 10=2.141, 25=1.9596, 100=1.7605, 250=1.66544, 500=1.60818, 1000=1.56105, 3000=1.50283, 6000=1.47434 (USD); Case/Package: QFN; Number of Pins: 16; Contact Plating: Gold; Min Operating Temperature: -40°C; Max Operating Temperature: 85°C; Packaging: Tape and Reel; Package Quantity: 3000; Number of Inputs: 4; Max Supply Voltage (DC): 5.5V; Series: microPOWER™; Length: 3mm; Height: 800um; Thickness: 750um; Lead Free: Lead Free; RoHS Compliant: Yes; ComponentLink1URL: https://datasheet.ciiva.com/1261/ads7924-1261034.pdf?src-supplier=Digikey; ComponentLink1Description: https://datasheet.ciiva.com/1261/ads7924-1261034.pdf?src-supplier=Digikey; ComponentLink2URL: https://datasheet.ciiva.com/1261/ads7924-1261035.pdf?src-supplier=Digikey; ComponentLink2Description: https://datasheet.ciiva.com/1261/ads7924-1261035.pdf?src-supplier=Digikey; ComponentLink3URL: https://datasheet.ciiva.com/1261/ads7924-1261036.pdf?src-supplier=Digikey; ComponentLink3Description: https://datasheet.ciiva.com/1261/ads7924-1261036.pdf?src-supplier=Digikey; Supplier Part Number 1: 296-27456-1-ND
footprint IC_ADC_QFN50P300X300X80-17N-D
pins: 1 ~{RESET}, 2 ~{INT}, 3 SCLK, 4 SDA, 5 A0, 6 DGND, 7 PWRCON, 8 AGND, 9 CH3, 10 CH2, 11 CH1, 12 CH0, 13 MUXOUT, 14 ADCIN, 15 AVDD, 16 DVDD, 17 EP

## IC_ADC_16BITS_LTC2451CDDB#TRMPBF
designator U?, comment LTC2451CDDB#TRMPBF
1-Channel Single ADC Delta-Sigma 60sps 16-bit Serial 8-Pin DFN EP T/R; Manufacturer: Analog Devices / Linear Technology; Interface: I2C,Serial; Max Supply Voltage: 5.5V; Min Supply Voltage: 2.7V; Number of Bits: 16; Sampling Rate: 60S/s; Number of Inputs: 1; Resolution: 16b; Nominal Supply Current: 400uA; Supplier 1: Digikey; Manufacturer Part Number: LTC2451CDDB#TRMPBF; RoHS: Yes; Category: Analog to Digital Converters (ADCs); Stock 1: 15780; Pricing 1: 1=3.77, 10=3.389, 25=3.2044, 100=2.777, 250=2.6346 (USD); Case/Package: DFN; Number of Pins: 8; Min Operating Temperature: 0°C; Max Operating Temperature: 70°C; Package Quantity: 500; Packaging: Cut Tape; Number of A/D Converters: 1; Reach SVHC Compliant: No; RoHS Compliant: Yes; ComponentLink1URL: https://datasheet.ciiva.com/6665/25830-6665339.pdf?src-supplier=Digikey; ComponentLink1Description: https://datasheet.ciiva.com/6665/25830-6665339.pdf?src-supplier=Digikey; ComponentLink2URL: https://datasheet.ciiva.com/6665/25830-6665341.pdf?src-supplier=Digikey; ComponentLink2Description: https://datasheet.ciiva.com/6665/25830-6665341.pdf?src-supplier=Digikey; ComponentLink3URL: https://datasheet.ciiva.com/6665/25830-6665385.pdf?src-supplier=Digikey; ComponentLink3Description: https://datasheet.ciiva.com/6665/25830-6665385.pdf?src-supplier=Digikey; ComponentLink4URL: https://datasheet.ciiva.com/5784/1441932-5784410.pdf?src-supplier=Farnell; ComponentLink4Description: https://datasheet.ciiva.com/5784/1441932-5784410.pdf?src-supplier=Farnell; ComponentLink5URL: https://datasheet.ciiva.com/5784/1441932-5784411.pdf?src-supplier=Farnell; ComponentLink5Description: https://datasheet.ciiva.com/5784/1441932-5784411.pdf?src-supplier=Farnell; ComponentLink6URL: https://datasheet.ciiva.com/8035/1441932-8035406.pdf?src-supplier=Element14; ComponentLink6Description: https://datasheet.ciiva.com/8035/1441932-8035406.pdf?src-supplier=Element14; Supplier Part Number 1: LTC2451CDDB#TRMPBFCT-ND
footprint IC_ADC_SON50P200X300X80-9N-D (TSOT-23)
pins: 1 GND_1, 2 REF-, 3 REF+, 4 VCC, 5 GND_2, 6 IN, 7 SCL, 8 SDA, 9 EP

## IC_ADC_24BITS_4CH_PCM1865DBTR
designator U?, comment PCM1865DBTR
110dB 4-Channel Software-Controlled Audio ADC With Universal Front End 30-TSSOP -40 to 125; Manufacturer: Texas Instruments; Interface: I2C,SPI,Serial; Operating Supply Voltage: 3.3V; Sampling Rate: 192KS/s; Resolution: 24b; Operating Supply Current: 31mA; Supply Type: Single; Power Consumption: 145mW; Number of ADC Channels: 4; Number of Analog Inputs: 8; Number of DAC Channels: 0; Supplier 1: Digikey; Manufacturer Part Number: PCM1865DBTR; RoHS: Yes; Category: Amplifiers - Audio; Stock 1: 1985; Pricing 1: 1=6.29, 10=4.833, 25=4.468, 100=4.0667, 250=3.87544, 500=3.76014, 1000=3.66527, 2000=3.57534 (USD); Mount: Surface Mount; Case/Package: TSSOP; Number of Pins: 30; Weight: 0.003439oz; Min Operating Temperature: -40°C; Max Operating Temperature: 125°C; Package Quantity: 2000; Packaging: Tape and Reel; Series: -; Lead Free: Lead Free; RoHS Compliant: Yes; ComponentLink1URL: https://datasheet.ciiva.com/29699/pcm1861-29699238.pdf?src-supplier=Digikey; ComponentLink1Description: https://datasheet.ciiva.com/29699/pcm1861-29699238.pdf?src-supplier=Digikey; ComponentLink2URL: https://datasheet.ciiva.com/48474/pcm1861-48474798.pdf?src-supplier=Avnet; ComponentLink2Description: https://datasheet.ciiva.com/48474/pcm1861-48474798.pdf?src-supplier=Avnet; Supplier Part Number 1: 296-PCM1865DBTRCT-ND
footprint IC_ADC_SOP50P640X120-30N
pins: 1 VINL2/VIN1M, 2 VINR2/VIN2M, 3 VINL1/VIN1P, 4 VINR1/VIN2P, 5 MIC_BIAS, 6 VREF, 7 AGND, 8 AVDD, 9 XO, 10 XI, 11 LDO, 12 DGND, 13 DVDD, 14 IOVDD, 15 SCKI, 16 LRCK, 17 BCK, 18 DOUT, 19 GPIO3/INTC, 20 GPIO2/INTB/DMCLK, 21 GPIO1/INTA/DMIN, 22 MISO/GPIO0/DMIN2, 23 MOSI/SDA, 24 MC/SCL, 25 MS/AD, 26 MD0, 27 VINL4/VIN4M, 28 VINR4/VIN3M, 29 VINL3/VIN4P, 30 VINR3/VIN3P

## IC_ADC_DAC_24BITS_ES7210
designator U?, comment ES7210
QFN-32-EP(4x4) ADCs/DACs - Special Purpose ROHS; Manufacturer: Everest-semi(Everest Semiconductor); Supplier: LCSC; Manufacturer part number: ES7210; ComponentLink1Description: Link Supplier; ComponentLink1URL: https://www.lcsc.com/product-detail/ADCs-DACs-Special-Purpose_Everest-semi-Everest-Semiconductor-ES7210_C365743.html
footprint IC_QFN40P400X400X55-33N
pins: 1 AD0, 2 AD1, 3 CDATA, 4 CCLK, 5 MCLK, 6 VDDP, 7 VDDD, 8 GNDD, 9 SCLK, 10 LRCK, 11 SDOUT1/TDMOUT, 12 SDOUT2/TDMIN, 13 INT, 14 DMIC_CLK, 15 MIC1N, 16 MIC1P, 17 REP12, 18 REFQ12, 19 MIC2P, 20 MIC2N, 21 GNDA, 22 VDDA, 23 VDDM, 24 MICBIAS12, 25 REFQM, 26 MICBIAS34, 27 MIC4N, 28 MIC4P, 29 REFP34, 30 REFQ34, 31 MIC3P, 32 MIC3N, 33 PAD

## IC_AMP_CLASSD_MAX98357AETE+T
designator U?, comment MAX98357AETE+T
IC AUDIO AMP CLASS D 16-TQFN; Manufacturer: Maxim; Voltage Gain: 15dB; Min Supply Voltage: 2.5V; Max Supply Voltage: 5.5V; Max Output Power: 3.2W; Power Supply Rejection Ratio (PSRR): 77dB; Supplier 1: Digikey; Manufacturer Part Number: MAX98357AETE+T; RoHS: Yes; Category: Amplifiers - Audio; Stock 1: 6952; Pricing 1: 1=4.17, 10=2.752, 25=2.3832, 100=1.9691, 250=1.76784, 500=1.6451, 1000=1.5431, 2500=1.43432, 5000=1.36811 (USD); Mount: Surface Mount; Number of Pins: 16; Min Operating Temperature: -40°C; Max Operating Temperature: 85°C; Packaging: Tape and Reel; Series: -; Radiation Hardening: No; RoHS Compliant: Yes; ComponentLink1URL: https://datasheet.ciiva.com/29970/max98357a-max98357b-29970280.pdf?src-supplier=Avnet; ComponentLink1Description: https://datasheet.ciiva.com/29970/max98357a-max98357b-29970280.pdf?src-supplier=Avnet; Supplier Part Number 1: MAX98357AETE+TCT-ND
footprint IC_AMP_QFN50P300X300X80-17N
pins: 1 DIN, 2 GAIN_SLOT, 3 GND_1, 4 ~{SD_MODE}, 5 N.C._1, 6 N.C._2, 7 VDD_1, 8 VDD_2, 9 OUTP, 10 OUTN, 11 GND_2, 12 N.C._3, 13 N.C._4, 14 LRCLK, 15 GND_3, 16 BCLK, 17 PAD